# Altium footprint library Herry.PcbLib: 74 footprints (part 1 of 5)
Each footprint in its own frame and in the unit in brackets; x right, y up, seen from the top. Pads: shape width x height; smd on the part's side, far side on the other; paste and mask are expansions set on the pad; w line width, h text height; cw(c..) or ccw(c..) is an arc to the next point about the centre after c.
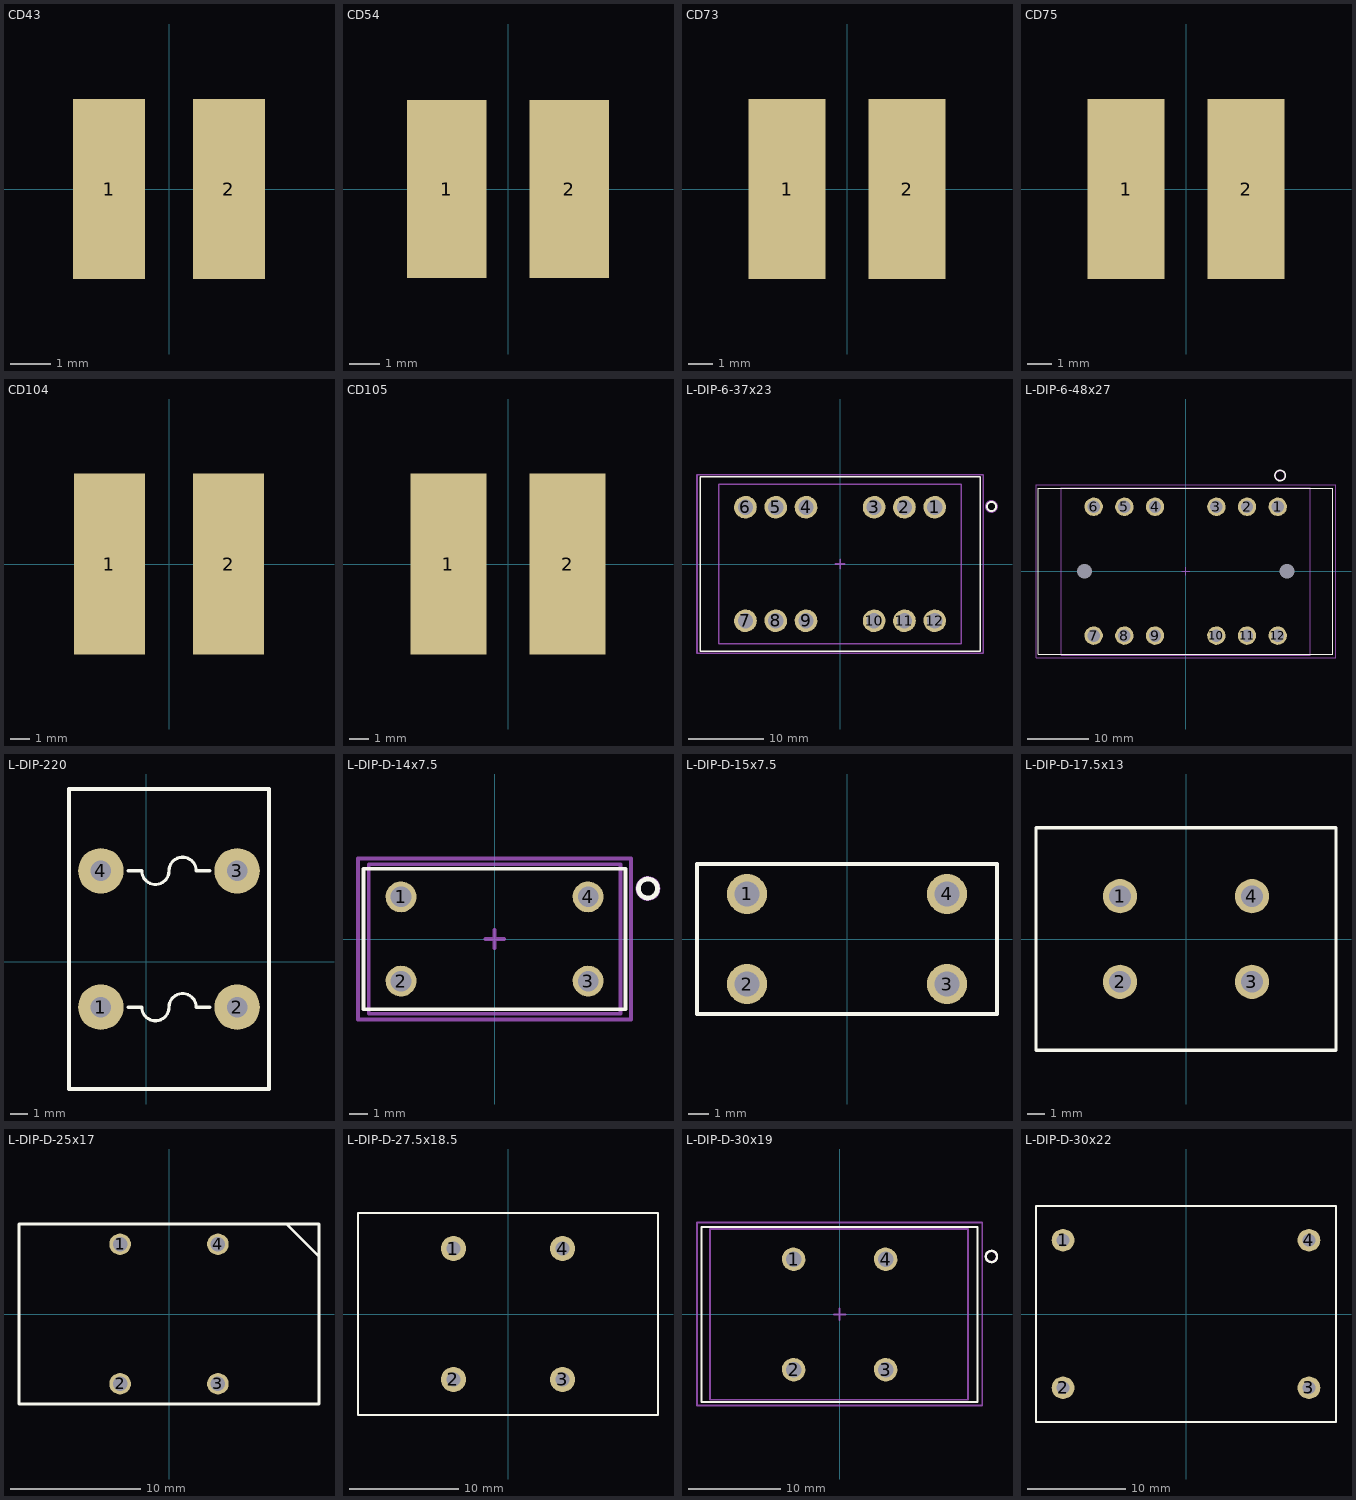
[diagram p0: the footprints below, top view; thin cyan lines are the x and y axes]

## CD43 [mm] "4.5 x 4 x 3.5 mm"
pads (2):
  rect 1.8x4.5 smd: 1(-1.5,0) 2(1.5,0)
3D body "SMD_Inductor_CD43.step": height 3.22, standoff -0.01, extent -2.25,-2 2.25,2

## CD54 [mm] "5.8 x 5.2 x 4.5 mm"
pads (2):
  rect 2.6x5.8 smd: 1(-2,0) 2(2,0)
3D body "SMD_Inductor_CD54.step": height 4.49, standoff -0.01, extent -2.9,-2.6 2.9,2.6

## CD73 [mm] "7.8 x 7.5 x 3.8 mm"
pads (2):
  rect 3.2x7.5 smd: 1(-2.5,0) 2(2.5,0)
3D body "SMD_Inductor_CD73.step": height 3.65, standoff -0.01, extent -3.9,-3.5 3.9,3.5

## CD75 [mm] "7.8 x 7.5 x 5.2 mm"
pads (2):
  rect 3.2x7.5 smd: 1(-2.5,0) 2(2.5,0)
3D body "SMD_Inductor_CD75.step": height 4.98, standoff -0.01, extent -3.9,-3.5 3.9,3.5

## CD104 [mm] "10 x 9 x 4.2 mm"
pads (2):
  rect 3.75x9.5 smd: 1(-3.125,0) 2(3.125,0)
3D body "SMD_Inductor_CD104.step": height 4.08, standoff -0.01, extent -5,-4.5 5,4.5

## CD105 [mm] "10 x 9 x 5.8 mm"
pads (2):
  rect 4x9.5 smd: 1(-3.125,0) 2(3.125,0)
3D body "SMD_Inductor_CD105.step": height 5.44, standoff -0.01, extent -5,-4.5 5,4.5

## L-DIP-6-37x23 [mm] "THT-12pin- Body 37mmx23mm"
height 36
pads (12):
  round 3 hole 2: 1(12.5,7.5) 2(8.5,7.5) 3(4.5,7.5) 4(-4.5,7.5) 5(-8.5,7.5) 6(-12.5,7.5) 7(-12.5,-7.5) 8(-8.5,-7.5) 9(-4.5,-7.5) 10(4.5,-7.5) 11(8.5,-7.5) 12(12.5,-7.5)
Top Overlay:
  circle w0.254: c20,7.6 r0.608
  lines w0.2: -18.5,-11.5 -18.5,11.5 18.5,11.5 18.5,-11.5 -18.5,-11.5
Mechanical 13:
  lines w0.2: -16.002,-10.541 16.002,-10.541 16.002,10.541 -16.002,10.541 -16.002,-10.541
Mechanical 15:
  circle w0.254: c20,7.6 r0.728
  lines w0.2: -0.635,0 0.635,0 ; 0,-0.635 0,0.635 ; -18.9,-11.8 18.9,-11.8 18.9,11.8 -18.9,11.8 -18.9,-11.8
  text ".Designator" at 0,0 h0.76
3D body "7448053201_37x23x35_trifilar_without pins.stp": height 30.75, standoff -4.9, extent -15.77,-10.3 15.766,10.3

## L-DIP-6-48x27 [mm] "THT-12pin- Body 48mmx27mm"
height 46
pads (14):
  round 3 hole 2 mask+0.102: 1(15,10.5) 2(10,10.5) 3(5,10.5) 4(-5,10.5) 5(-10,10.5) 6(-15,10.5) 7(-15,-10.5) 8(-10,-10.5) 9(-5,-10.5) 10(5,-10.5) 11(10,-10.5) 12(15,-10.5)
  round 0 hole 2.4 unplated: mh1(16.5,0) mh2(-16.5,0)
Top Overlay:
  circle w0.254: c15.4,15.6 r0.854
  lines w0.2: -24,-13.5 24,-13.5 24,13.5 -24,13.5 -24,-13.5
Mechanical 13:
  lines w0.2: -20.32,-13.7 -20.32,13.6 20.3,13.6 20.3,-13.7 -20.32,-13.7
Mechanical 15:
  circle w0.254: c15.4,15.6 r0.806
  lines w0.2: -0.635,0 0.635,0 ; 0,-0.635 0,0.635 ; -24.4,-14.1 -24.4,14.1 24.5,14.1 24.5,-14.1 -24.4,-14.1
  text ".Designator" at 0,-0.1 h0.76
3D body "7448063801_48x27x46_trifilar_wop.stp": height 39, standoff -5.1, extent -20,-13.25 20,13.25

## L-DIP-220 [mil] "Loc 220"
pads (4):
  round 100 hole 45: 1(-100,-100) 2(200,-100) 3(200,200) 4(-100,200)
Top Overlay:
  lines w7: -10,-100 ccw(c20,-100) 50,-100 cw(c80,-100) 110,-100 ; -10,200 ccw(c20,200) 50,200 cw(c80,200) 110,200
  lines w8: -40,-100 -10,-100 ; -40,200 -10,200 ; 110,-100 140,-100 ; 110,200 140,200 ; -170,-280 270,-280 270,380 -170,380 -170,-280

## L-DIP-D-14x7.5 [mm] "THT-4pin- Body 14x7.5mm"
height 16
pads (4):
  round 1.65 hole 1.1: 1(-5,2.25) 2(-5,-2.25) 3(5,-2.25) 4(5,2.25)
Top Overlay:
  circle w0.254: c8.2,2.7 r0.51
  lines w0.2: -7,3.75 -7,-3.75 7,-3.75 7,3.75 ; -6.985,3.75 6.985,3.75
Mechanical 13:
  lines w0.2: -6.731,-4 -6.731,4 6.731,4 6.731,-4 -6.731,-4
Mechanical 15:
  circle w0.254: c8.2,2.7 r0.539
  lines w0.2: -0.5,0 0.5,0 ; 0,-0.5 0,0.5 ; -7.3,-4.3 7.3,-4.3 7.3,4.3 -7.3,4.3 -7.3,-4.3
  text ".Designator" at 0,0 h0.76
3D body "7448010911_14x7,5x16.stp": height 14.6, standoff -2.5, extent -6.5,-3.75 6.5,3.75

## L-DIP-D-15x7.5 [mm] "THT Inductor, 2-Leads, Body 15,0x7,5mm"
height 18
pads (4):
  round 2 hole 1.27: 1(-5,2.25) 2(-5,-2.25) 3(5,-2.25) 4(5,2.25)
Top Overlay:
  lines w0.2: -7.5,-3.75 -7.5,3.75 7.5,3.75 7.5,-3.75 -7.5,-3.75
Mechanical 1:
  lines w0.1: -7.5,-3.75 -7.5,3.75 7.5,3.75 7.5,-3.75 -7.5,-3.75
3D body "744821240.stp": height 16.22, standoff -3.6, extent -6.897,-3.75 6.897,3.75

## L-DIP-D-17.5x13 [mm] "THT Inductor, 4-Leads, Body 17,5x13,0mm"
height 22
pads (4):
  round 2 hole 1.27: 1(-3.85,2.5) 2(-3.85,-2.5) 3(3.85,-2.5) 4(3.85,2.5)
Top Overlay:
  lines w0.2: -8.75,-6.5 -8.75,6.5 8.75,6.5 8.75,-6.5 -8.75,-6.5
Mechanical 1:
  lines w0.1: -8.75,-6.5 -8.75,6.5 8.75,6.5 8.75,-6.5 -8.75,-6.5
3D body "744822301.stp": height 20.01, standoff -2.99, extent -7.769,-6.5 7.769,6.5

## L-DIP-D-25x17 [mm] "THT Inductor, 4-Leads, Body 25,0x17,0mm"
height 28
pads (4):
  round 1.65 hole 1.1: 1(-3.75,5.35) 2(-3.75,-5.35) 3(3.75,-5.35) 4(3.75,5.35)
Top Overlay:
  lines w0.2: 9,6.9 11.5,4.4 ; -11.5,-6.9 -11.5,6.9 11.5,6.9 11.5,-6.9 -11.5,-6.9
Mechanical 1:
  lines w0.1: -11.5,-6.9 -11.5,6.9 11.5,6.9 11.5,-6.9 -11.5,-6.9
3D body "744823220_M.stp": height 23.09, standoff -5.01, extent -9.55,-6.5 9.55,6.5

## L-DIP-D-27.5x18.5 [mm] "THT Inductor, 4-Leads, Body 27,5x18,5mm"
height 33
pads (4):
  round 2.3 hole 1.3: 1(-5,6) 2(-5,-6) 3(5,-6) 4(5,6)
Top Overlay:
  lines w0.2: -13.75,-9.25 13.75,-9.25 13.75,9.25 -13.75,9.25 -13.75,-9.25
Mechanical 1:
  lines w0.1: -13.75,-9.25 13.75,-9.25 13.75,9.25 -13.75,9.25 -13.75,-9.25
3D body "744824407.stp": height 33, standoff -5, extent -13.75,-9.3 13.75,9.2

## L-DIP-D-30x19 [mm] "THT-4pin- Body 30x19mm"
height 32
pads (4):
  round 2.55 hole 1.7: 1(-5,6) 2(-5,-6) 3(5,-6) 4(5,6)
Top Overlay:
  circle w0.254: c16.5,6.3 r0.608
  lines w0.2: -15,-9.5 15,-9.5 15,9.5 -15,9.5 -15,-9.5
Mechanical 13:
  lines w0.2: -14.097,-9.271 -14.097,9.271 13.97,9.271 13.97,-9.271 -14.097,-9.271
Mechanical 15:
  circle w0.254: c16.5,6.3 r0.6
  lines w0.2: -0.635,0 0.635,0 ; 0,-0.635 0,0.635 ; -15.5,-9.9 -15.5,10 15.5,10 15.5,-9.9 -15.5,-9.9
  text ".Designator" at 0,0 h0.76
3D body "7448041502.stp": height 25.72, standoff -4.75, extent -13.75,-9 13.75,9

## L-DIP-D-30x22 [mm] "THT Inductor, 4-Leads, Body 30,0x22,0mm"
height 35
pads (4):
  round 2.3 hole 1.3: 1(-12.5,7.5) 2(-12.5,-7.5) 3(12.5,-7.5) 4(12.5,7.5)
Top Overlay:
  lines w0.2: -15.25,-11 15.25,-11 15.25,11 -15.25,11 -15.25,-11
Mechanical 1:
  lines w0.1: -15.25,-11 15.25,-11 15.25,11 -15.25,11 -15.25,-11
3D body "7448258022.stp": height 35.13, standoff -5, extent -15,-10.5 15,10.5